# Altium footprint library CADTchip.PcbLib: 195 footprints (part 11 of 13)
Each footprint in its own frame and in the unit in brackets; x right, y up, seen from the top. Pads: shape width x height; smd on the part's side, far side on the other; paste and mask are expansions set on the pad; w line width, h text height; cw(c..) or ccw(c..) is an arc to the next point about the centre after c.
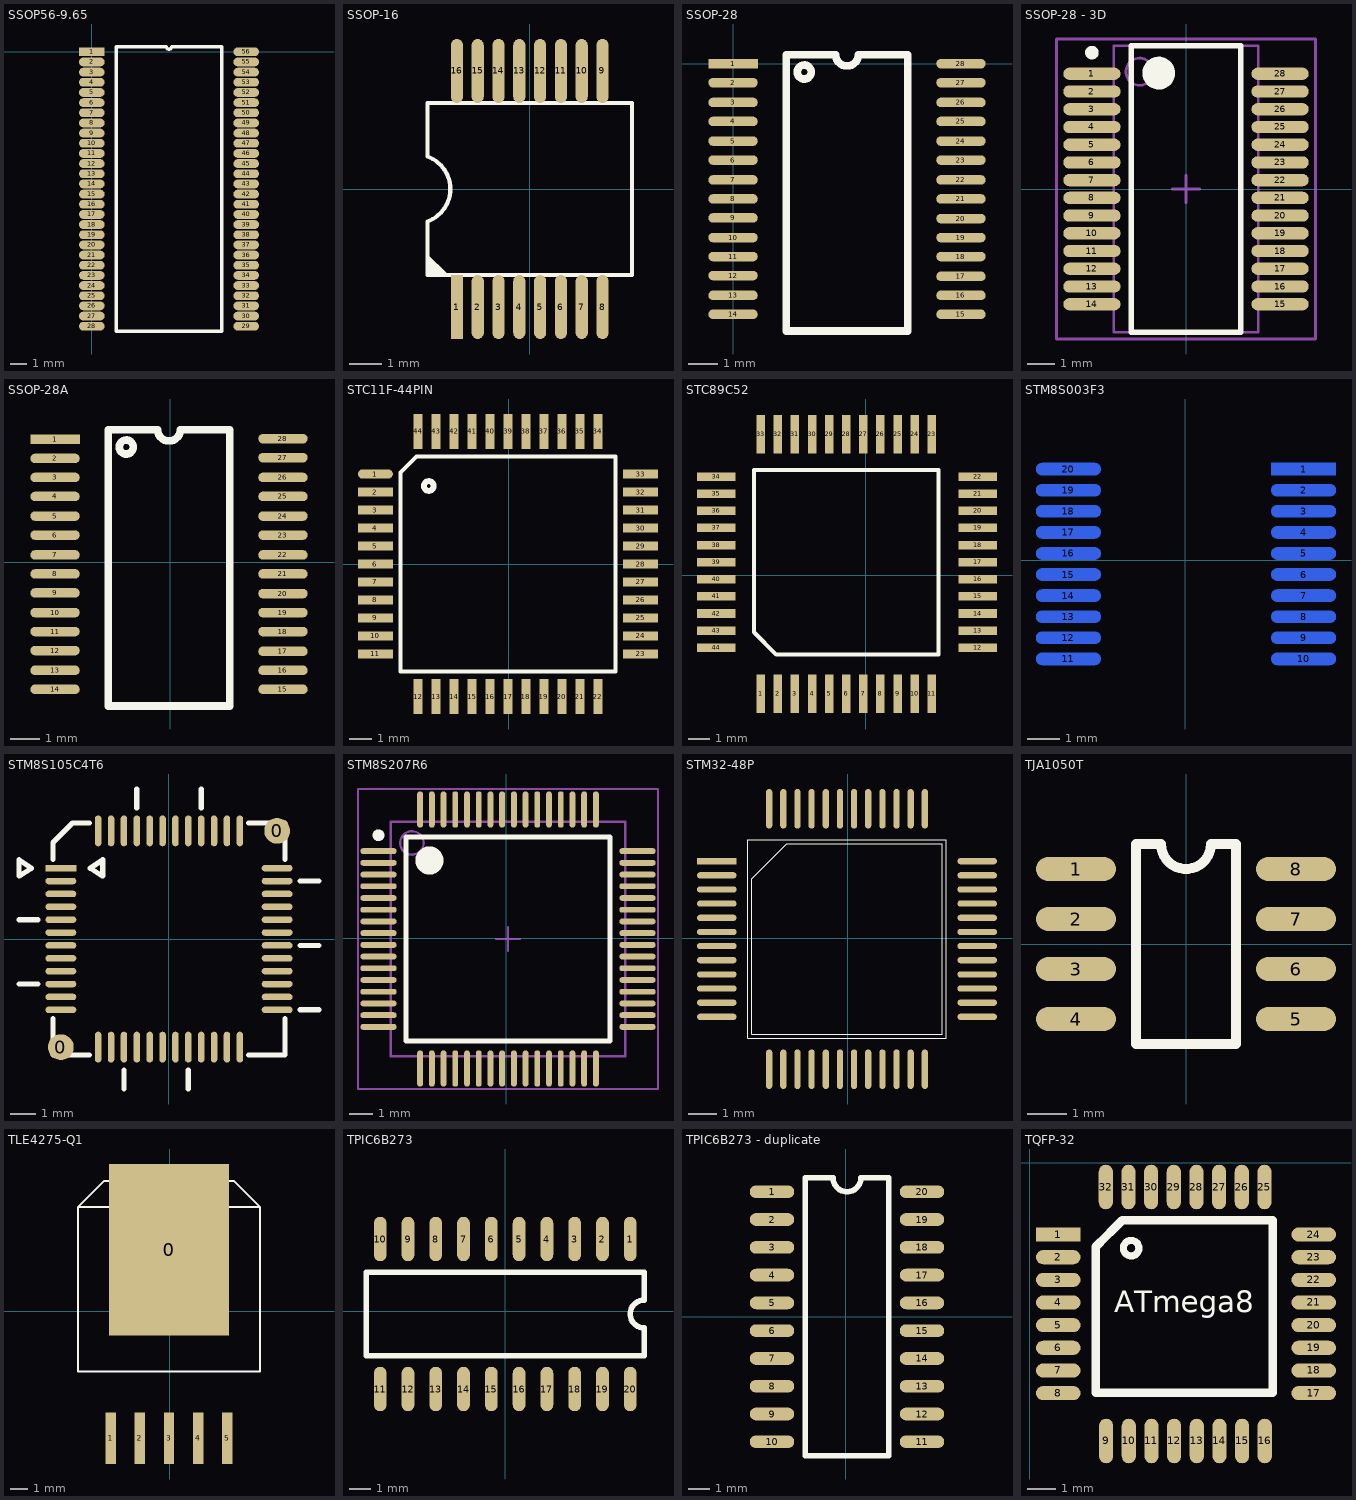
[diagram p10: the footprints below, top view; thin cyan lines are the x and y axes]

## SSOP56-9.65 [mm]
pads (56):
  rect 1.6x0.55 smd: 1(0,0)
  oval 1.6x0.55 smd: 2(0,-0.635) 3(0,-1.27) 4(0,-1.905) 5(0,-2.54) 6(0,-3.175) 7(0,-3.81) 8(0,-4.445) 9(0,-5.08) 10(0,-5.715) 11(0,-6.35) 12(0,-6.985) 13(0,-7.62) 14(0,-8.255) 15(0,-8.89) 16(0,-9.525) 17(0,-10.16) 18(0,-10.795) 19(0,-11.43) 20(0,-12.065) 21(0,-12.7) 22(0,-13.335) 23(0,-13.97) 24(0,-14.605) 25(0,-15.24) 26(0,-15.875) 27(0,-16.51) 28(0,-17.145) 29(9.65,-17.145) 30(9.65,-16.51) 31(9.65,-15.875) 32(9.65,-15.24) 33(9.65,-14.605) 34(9.65,-13.97) 35(9.65,-13.335) 36(9.65,-12.7) 37(9.65,-12.065) 38(9.65,-11.43) 39(9.65,-10.795) 40(9.65,-10.16) 41(9.65,-9.525) 42(9.65,-8.89) 43(9.65,-8.255) 44(9.65,-7.62) 45(9.65,-6.985) 46(9.65,-6.35) 47(9.65,-5.715) 48(9.65,-5.08) 49(9.65,-4.445) 50(9.65,-3.81) 51(9.65,-3.175) 52(9.65,-2.54) 53(9.65,-1.905) 54(9.65,-1.27) 55(9.65,-0.635) 56(9.65,0)
Top Overlay:
  lines w0.2: 1.535,-17.462 8.115,-17.462 8.115,0.318 4.984,0.318 cw(c4.825,0.318) 4.666,0.318 1.535,0.318 1.535,-17.462

## SSOP-16 [mm]
height 2
pads (16):
  rect 0.38x2 smd: 1(-2.274,-3.688)
  oval 0.38x2 smd: 2(-1.625,-3.688) 3(-0.974,-3.688) 4(-0.325,-3.688) 5(0.326,-3.688) 6(0.975,-3.688) 7(1.626,-3.688) 8(2.275,-3.688) 9(2.275,3.688) 10(1.625,3.688) 11(0.975,3.688) 12(0.325,3.688) 13(-0.325,3.688) 14(-0.975,3.688) 15(-1.625,3.688) 16(-2.275,3.688)
Top Overlay:
  region: -3.2,-2.688 -3.2,-2.032 -2.593,-2.63 -2.569,-2.688 -2.576,-2.688
  lines w0.127: 3.2,-2.688 -3.2,-2.688 -3.2,-1.016 ccw(c-3.556,0) -3.2,1.016 -3.2,2.692 3.2,2.692 3.2,-2.662

## SSOP-28 [mil]
pads (28):
  rect 65x12.5 smd: 1(0,0)
  oval 65x12.5 smd: 2(0,-25) 3(0,-51) 4(0,-76) 5(0,-102) 6(0,-127) 7(0,-153) 8(0,-178) 9(0,-203) 10(0,-229) 11(0,-254) 12(0,-279) 13(0,-305) 14(0,-330) 15(300,-330) 16(300,-305) 17(300,-280) 18(300,-254) 19(300,-229) 20(300,-204) 21(300,-178) 22(300,-153) 23(300,-127) 24(300,-102) 25(300,-76) 26(300,-51) 27(300,-25) 28(300,0)
Top Overlay:
  circle w10: c93.78,-11 r9.22
  lines w10: 70,-352 70,12 135,12 ccw(c150,12) 165,12 230,12 230,-352 70,-352
3D body: height 78.74, standoff 9.84, extent 46.67,-377.69 255.33,35.69

## SSOP-28 - 3D [mm] "SOP, 28-Leads, Body 10.5x5.3mm (max), Pitch 0.65mm, IPC Medium Density"
height 2
pads (28):
  oval 2.1x0.45 smd: 1(-3.45,4.225) 2(-3.45,3.575) 3(-3.45,2.925) 4(-3.45,2.275) 5(-3.45,1.625) 6(-3.45,0.975) 7(-3.45,0.325) 8(-3.45,-0.325) 9(-3.45,-0.975) 10(-3.45,-1.625) 11(-3.45,-2.275) 12(-3.45,-2.925) 13(-3.45,-3.575) 14(-3.45,-4.225) 15(3.45,-4.225) 16(3.45,-3.575) 17(3.45,-2.925) 18(3.45,-2.275) 19(3.45,-1.625) 20(3.45,-0.975) 21(3.45,-0.325) 22(3.45,0.325) 23(3.45,0.975) 24(3.45,1.625) 25(3.45,2.275) 26(3.45,2.925) 27(3.45,3.575) 28(3.45,4.225)
Top Overlay:
  circle w0.25: c-3.45,5 r0.125
  circle w0.6: c-1,4.25 r0.3
  lines w0.2: -2,-5.25 -2,5.25 2,5.25 2,-5.25 -2,-5.25
Mechanical 13:
  circle w0.1: c-1.7,4.3 r0.5
  lines w0.1: -2.65,-5.25 -2.65,5.25 2.65,5.25 2.65,-5.25 -2.65,-5.25
Mechanical 15:
  lines w0.1: -0.5,0 0.5,0 ; 0,-0.5 0,0.5 ; -4.75,-5.5 -4.75,5.5 4.75,5.5 4.75,-5.5 -4.75,-5.5
3D body: height 2, standoff 0.25, extent -2.65,-5.25 2.65,5.25

## SSOP-28A [mil]
pads (28):
  rect 65x12.5 smd: 1(-151.6,161.74)
  oval 65x12.5 smd: 2(-151.6,136.74) 3(-151.6,111.74) 4(-151.6,86.74) 5(-151.6,60.74) 6(-151.6,35.74) 7(-151.6,9.74) 8(-151.6,-15.26) 9(-151.6,-40.26) 10(-151.6,-66.26) 11(-151.6,-91.26) 12(-151.6,-116.26) 13(-151.6,-142.26) 14(-151.6,-167.26) 15(148.4,-167.26) 16(148.4,-142.26) 17(148.4,-117.26) 18(148.4,-91.26) 19(148.4,-66.26) 20(148.4,-41.26) 21(148.4,-15.26) 22(148.4,9.74) 23(148.4,35.74) 24(148.4,60.74) 25(148.4,86.74) 26(148.4,111.74) 27(148.4,137.74) 28(148.4,162.74)
Top Overlay:
  circle w10: c-57.82,151.74 r9.22
  lines w10: -81.6,-189.26 78.4,-189.26 78.4,174.74 13.4,174.74 cw(c-1.6,174.74) -16.6,174.74 -81.6,174.74 -81.6,-189.26

## STC11F-44PIN [mil] "STC-44P"
pads (44):
  oval 60x16 smd: 1(-230,155)
  rect 60x16 smd: 2(-230,124) 3(-230,93) 4(-230,62) 5(-230,31) 6(-230,0) 7(-230,-31) 8(-230,-62) 9(-230,-93) 10(-230,-124) 11(-230,-155) 23(226.69,-155) 24(226.69,-124) 25(226.69,-93) 26(226.69,-62) 27(226.69,-31) 28(226.69,0) 29(226.69,31) 30(226.69,62) 31(226.69,93) 32(226.69,124) 33(226.69,155)
  rect 16x60 smd: 12(-156.65,-228.35) 13(-125.65,-228.35) 14(-94.65,-228.35) 15(-63.65,-228.35) 16(-32.65,-228.35) 17(-1.65,-228.35) 18(29.35,-228.35) 19(60.35,-228.35) 20(91.35,-228.35) 21(122.35,-228.35) 22(153.35,-228.35) 34(153.35,228.35) 35(122.35,228.35) 36(91.35,228.35) 37(60.35,228.35) 38(29.35,228.35) 39(-1.65,228.35) 40(-32.65,228.35) 41(-63.65,228.35) 42(-94.65,228.35) 43(-125.65,228.35) 44(-156.65,228.35)
Top Overlay:
  circle w10: c-138.04,134.34 r8.41
  lines w7: -186.69,-185.04 183.39,-185.04 183.39,185.04 -159.13,185.04 -186.69,157.48 -186.69,-185.04

## STC89C52 [mm] "LQFP-44"
height 0.6
pads (44):
  rect 0.4x1.8 smd: 1(-4.92,-5.53) 2(-4.12,-5.53) 3(-3.32,-5.53) 4(-2.52,-5.53) 5(-1.72,-5.53) 6(-0.92,-5.53) 7(-0.12,-5.53) 8(0.68,-5.53) 9(1.48,-5.53) 10(2.28,-5.53) 11(3.08,-5.53) 23(3.08,6.6) 24(2.28,6.6) 25(1.48,6.6) 26(0.68,6.6) 27(-0.12,6.6) 28(-0.92,6.6) 29(-1.72,6.6) 30(-2.52,6.6) 31(-3.32,6.6) 32(-4.12,6.6) 33(-4.92,6.6)
  rect 1.8x0.4 smd: 12(5.23,-3.38) 13(5.23,-2.58) 14(5.23,-1.78) 15(5.23,-0.98) 16(5.23,-0.18) 17(5.23,0.62) 18(5.23,1.42) 19(5.23,2.22) 20(5.23,3.02) 21(5.23,3.82) 22(5.23,4.62) 34(-7,4.62) 35(-7,3.82) 36(-7,3.02) 37(-7,2.22) 38(-7,1.42) 39(-7,0.62) 40(-7,-0.18) 41(-7,-0.98) 42(-7,-1.78) 43(-7,-2.58) 44(-7,-3.38)
Top Overlay:
  lines w0.2: -5.235,-2.66 -5.235,4.935 3.395,4.935 3.395,-3.695 -4.2,-3.695 -5.235,-2.66

## STM8S003F3 [mm]
pads (20):
  rect 2x0.38 smd far side: 1(3.651,2.807)
  oval 2x0.38 smd far side: 2(3.651,2.157) 3(3.651,1.507) 4(3.651,0.857) 5(3.651,0.207) 6(3.651,-0.443) 7(3.651,-1.093) 8(3.651,-1.743) 9(3.651,-2.393) 10(3.651,-3.043) 11(-3.599,-3.043) 12(-3.599,-2.393) 13(-3.599,-1.743) 14(-3.599,-1.093) 15(-3.599,-0.443) 16(-3.599,0.207) 17(-3.599,0.857) 18(-3.599,1.507) 19(-3.599,2.157) 20(-3.599,2.807)
Bottom Overlay:
  lines w0.2: -0.499,3.132 -2.264,3.132 -2.264,-3.368 2.316,-3.368 2.316,3.132 0.551,3.132 ; -0.474,3.132 ccw(c0.026,3.132) 0.526,3.132

## STM8S105C4T6 [mm]
pads (50):
  round 1 smd: 0(-4.2,-4.2) 0(4.2,4.2)
  rect 1.2x0.25 smd: 1(-4.2,2.75)
  oval 1.2x0.25 smd: 2(-4.2,2.25) 3(-4.2,1.75) 4(-4.2,1.25) 5(-4.2,0.75) 6(-4.2,0.25) 7(-4.2,-0.25) 8(-4.2,-0.75) 9(-4.2,-1.25) 10(-4.2,-1.75) 11(-4.2,-2.25) 12(-4.2,-2.75) 25(4.2,-2.75) 26(4.2,-2.25) 27(4.2,-1.75) 28(4.2,-1.25) 29(4.2,-0.75) 30(4.2,-0.25) 31(4.2,0.25) 32(4.2,0.75) 33(4.2,1.25) 34(4.2,1.75) 35(4.2,2.25) 36(4.2,2.75)
  oval 0.25x1.2 smd: 13(-2.75,-4.2) 14(-2.25,-4.2) 15(-1.75,-4.2) 16(-1.25,-4.2) 17(-0.75,-4.2) 18(-0.25,-4.2) 19(0.25,-4.2) 20(0.75,-4.2) 21(1.25,-4.2) 22(1.75,-4.2) 23(2.25,-4.2) 24(2.75,-4.2) 37(2.75,4.2) 38(2.25,4.2) 39(1.75,4.2) 40(1.25,4.2) 41(0.75,4.2) 42(0.25,4.2) 43(-0.25,4.2) 44(-0.75,4.2) 45(-1.25,4.2) 46(-1.75,4.2) 47(-2.25,4.2) 48(-2.75,4.2)
Top Overlay:
  lines w0.2: -5.826,-1.75 -5.089,-1.75 ; -5.826,0.75 -5.089,0.75 ; -4.5,-3.092 -4.5,-4.5 -3.092,-4.5 ; -4.5,3.092 -4.5,3.743 -3.743,4.5 -3.092,4.5 ; -1.75,-5.826 -1.75,-5.089 ; -1.25,5.089 -1.25,5.826 ; 0.75,-5.826 0.75,-5.089 ; 1.25,5.089 1.25,5.826 ; 3.092,-4.5 4.5,-4.5 4.5,-3.092 ; 3.092,4.5 4.5,4.5 4.5,3.092 ; 5.089,-2.75 5.826,-2.75 ; 5.089,-0.25 5.826,-0.25 ; 5.089,2.25 5.826,2.25 ; -5.826,2.445 -5.826,3.08 -5.343,2.75 -5.826,2.445 ; -3.057,2.75 -2.574,2.445 -2.574,3.08 -3.057,2.75
3D body: height 1.45, standoff 0, extent -4.5,-4.504 4.5,4.496

## STM8S207R6 [mm]
pads (64):
  oval 1.55x0.25 smd: 1(-5.455,3.725) 2(-5.455,3.225) 3(-5.455,2.725) 4(-5.455,2.225) 5(-5.455,1.725) 6(-5.455,1.225) 7(-5.455,0.725) 8(-5.455,0.225) 9(-5.455,-0.275) 10(-5.455,-0.775) 11(-5.455,-1.275) 12(-5.455,-1.775) 13(-5.455,-2.275) 14(-5.455,-2.775) 15(-5.455,-3.275) 16(-5.455,-3.775) 33(5.595,-3.775) 34(5.595,-3.275) 35(5.595,-2.775) 36(5.595,-2.275) 37(5.595,-1.775) 38(5.595,-1.275) 39(5.595,-0.775) 40(5.595,-0.275) 41(5.595,0.225) 42(5.595,0.725) 43(5.595,1.225) 44(5.595,1.725) 45(5.595,2.225) 46(5.595,2.725) 47(5.595,3.225) 48(5.595,3.725)
  oval 0.25x1.55 smd: 17(-3.68,-5.55) 18(-3.18,-5.55) 19(-2.68,-5.55) 20(-2.18,-5.55) 21(-1.68,-5.55) 22(-1.18,-5.55) 23(-0.68,-5.55) 24(-0.18,-5.55) 25(0.32,-5.55) 26(0.82,-5.55) 27(1.32,-5.55) 28(1.82,-5.55) 29(2.32,-5.55) 30(2.82,-5.55) 31(3.32,-5.55) 32(3.82,-5.55) 49(3.82,5.5) 50(3.32,5.5) 51(2.82,5.5) 52(2.32,5.5) 53(1.82,5.5) 54(1.32,5.5) 55(0.82,5.5) 56(0.32,5.5) 57(-0.18,5.5) 58(-0.68,5.5) 59(-1.18,5.5) 60(-1.68,5.5) 61(-2.18,5.5) 62(-2.68,5.5) 63(-3.18,5.5) 64(-3.68,5.5)
Top Overlay:
  circle w0.6: c-3.28,3.325 r0.3
  circle w0.25: c-5.455,4.4 r0.125
  lines w0.2: -4.28,-4.375 4.42,-4.375 4.42,4.325 -4.28,4.325 -4.28,-4.375
Mechanical 13:
  circle w0.1: c-4.03,4.075 r0.5
  lines w0.1: -4.93,-5.025 5.07,-5.025 5.07,4.975 -4.93,4.975 -4.93,-5.025
Mechanical 15:
  lines w0.1: -0.43,-0.025 0.57,-0.025 ; 0.07,-0.525 0.07,0.475 ; -6.33,-6.425 6.47,-6.425 6.47,6.375 -6.33,6.375 -6.33,-6.425
3D body: height 1.6, standoff 0, extent -4.93,-5.025 5.07,4.975

## STM32-48P [mm] "STM32F100C8T6,LQFP-48"
height 1
pads (48):
  rect 1.4x0.22 smd: 1(-4.625,2.725)
  oval 1.4x0.22 smd: 2(-4.625,2.225) 3(-4.625,1.725) 4(-4.625,1.225) 5(-4.625,0.725) 6(-4.625,0.225) 7(-4.625,-0.275) 8(-4.625,-0.775) 9(-4.625,-1.275) 10(-4.625,-1.775) 11(-4.625,-2.275) 12(-4.625,-2.775) 25(4.575,-2.775) 26(4.575,-2.275) 27(4.575,-1.775) 28(4.575,-1.275) 29(4.575,-0.775) 30(4.575,-0.275) 31(4.575,0.225) 32(4.575,0.725) 33(4.575,1.225) 34(4.575,1.725) 35(4.575,2.225) 36(4.575,2.725)
  oval 0.22x1.4 smd: 13(-2.775,-4.625) 14(-2.275,-4.625) 15(-1.775,-4.625) 16(-1.275,-4.625) 17(-0.775,-4.625) 18(-0.275,-4.625) 19(0.225,-4.625) 20(0.725,-4.625) 21(1.225,-4.625) 22(1.725,-4.625) 23(2.225,-4.625) 24(2.725,-4.625) 37(2.725,4.575) 38(2.225,4.575) 39(1.725,4.575) 40(1.225,4.575) 41(0.725,4.575) 42(0.225,4.575) 43(-0.275,4.575) 44(-0.775,4.575) 45(-1.275,4.575) 46(-1.775,4.575) 47(-2.275,4.575) 48(-2.775,4.575)
Top Overlay:
  lines w0.025: -3.525,-3.525 3.475,-3.525 3.475,3.475 -3.525,3.475 -3.525,-0.025 -3.525,-3.525 ; -3.39,-3.39 -3.39,2.105 -2.155,3.34 3.34,3.34 3.34,-3.39 -3.39,-3.39
3D body: height 1.45, standoff 0, extent -4.525,-4.53 4.475,4.47

## TJA1050T [mil]
pads (8):
  oval 80x24 smd: 1(-110,75) 2(-110,25) 3(-110,-25) 4(-110,-75) 5(110,-75) 6(110,-25) 7(110,25) 8(110,75)
Top Overlay:
  lines w10: -50,-100 50,-100 50,100 25,100 cw(c0,100) -25,100 -50,100 -50,-100

## TLE4275-Q1 [mm]
pads (6):
  rect 7x10 smd: 0(-0.034,3.596)
  rect 0.6x3 smd: 1(-3.434,-7.404) 2(-1.734,-7.404) 3(-0.034,-7.404) 4(1.666,-7.404) 5(3.366,-7.404)
Top Overlay:
  lines w0.127: -5.334,6.096 5.266,6.096 ; -5.334,6.096 -5.334,-3.504 5.266,-3.504 5.266,6.096 ; -5.334,6.096 -3.834,7.596 3.766,7.596 5.266,6.096

## TPIC6B273 [mil]
pads (20):
  oval 23x80 smd: 1(225,130) 2(175,130) 3(125,130) 4(75,130) 5(25,130) 6(-25,130) 7(-75,130) 8(-125,130) 9(-175,130) 10(-225,130) 11(-225,-140) 12(-175,-140) 13(-125,-140) 14(-75,-140) 15(-25,-140) 16(25,-140) 17(75,-140) 18(125,-140) 19(175,-140) 20(225,-140)
Top Overlay:
  lines w10: -250,-80 250,-80 250,-30 cw(c250,-5) 250,20 250,70 -250,70 -250,-80

## TPIC6B273 - duplicate [mil]
pads (20):
  oval 80x23 smd: 1(-133,225) 2(-133,175) 3(-133,125) 4(-133,75) 5(-133,25) 6(-133,-25) 7(-133,-75) 8(-133,-125) 9(-133,-175) 10(-133,-225) 11(137,-225) 12(137,-175) 13(137,-125) 14(137,-75) 15(137,-25) 16(137,25) 17(137,75) 18(137,125) 19(137,175) 20(137,225)
Top Overlay:
  lines w10: -73,-250 -73,250 -23,250 ccw(c2,250) 27,250 77,250 77,-250 -73,-250

## TQFP-32 [mil]
pads (32):
  rect 62x19.68 smd: 1(40,-100)
  oval 62x19.68 smd: 2(40,-131.5) 3(40,-162.99) 4(40,-194.49) 5(40,-225.98) 6(40,-257.48) 7(40,-288.98) 8(40,-320.47) 17(395,-320.47) 18(395,-288.98) 19(395,-257.48) 20(395,-225.98) 21(395,-194.49) 22(395,-162.99) 23(395,-131.5) 24(395,-100)
  oval 19.68x62 smd: 9(106.51,-387) 10(138.01,-387) 11(169.5,-387) 12(201,-387) 13(232.5,-387) 14(263.99,-387) 15(295.49,-387) 16(326.98,-387) 25(326.52,-33.95) 26(295.02,-33.95) 27(263.53,-33.95) 28(232.03,-33.95) 29(200.53,-33.95) 30(169.04,-33.95) 31(137.54,-33.95) 32(106.05,-33.95)
Top Overlay:
  circle w10: c141.23,-119 r10.77
  lines w12: 93,-116 129,-80 338,-80 338,-320 92,-320 92,-117 98.99,-110.01
  text "ATmega8" at 118,-208 h30